# Altium footprint library SparkFun.PCBLIB: 674 footprints (part 8 of 44)
Each footprint in its own frame and in the unit in brackets; x right, y up, seen from the top. Pads: shape width x height; smd on the part's side, far side on the other; paste and mask are expansions set on the pad; w line width, h text height; cw(c..) or ccw(c..) is an arc to the next point about the centre after c.
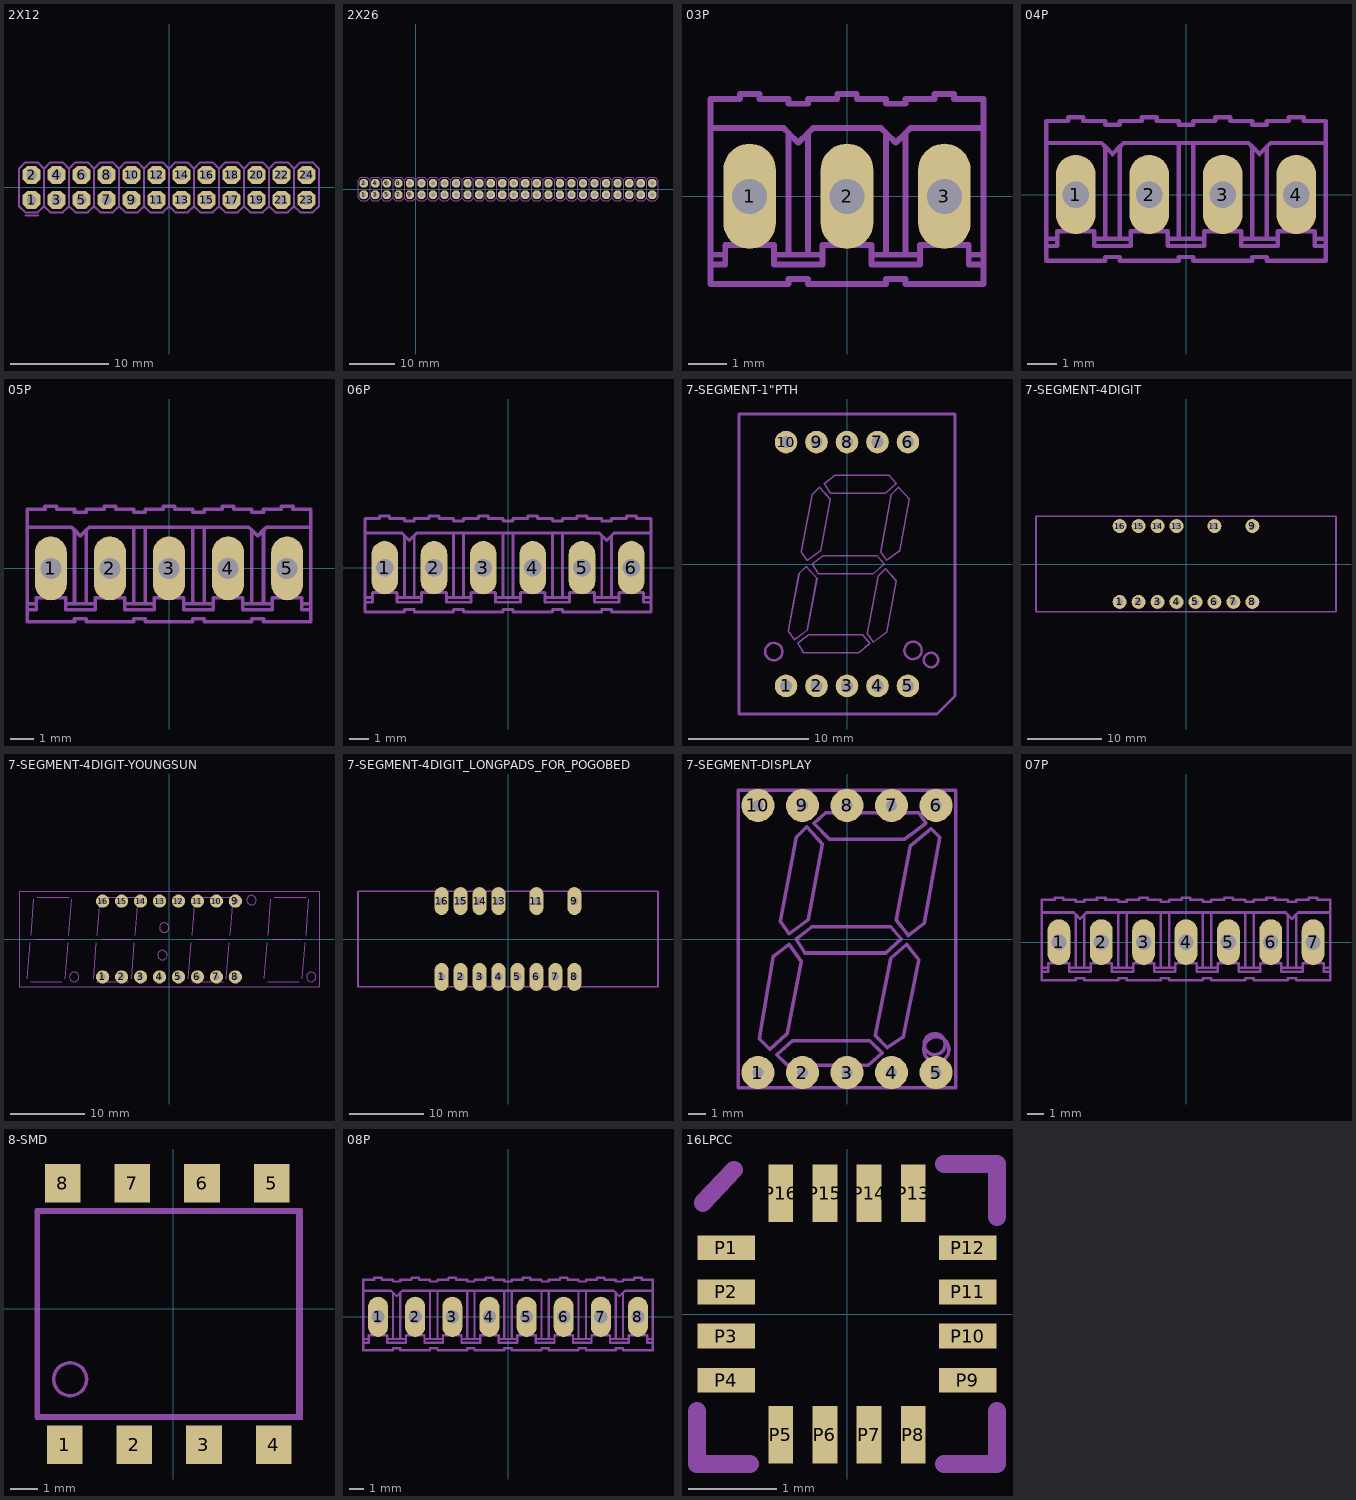
[diagram p7: the footprints below, top view; thin cyan lines are the x and y axes]

## 2X12 [mil]
pads (24):
  oct 71.65x71.65 hole 40: 1(-550,-50) 2(-550,50) 3(-450,-50) 4(-450,50) 5(-350,-50) 6(-350,50) 7(-250,-50) 8(-250,50) 9(-150,-50) 10(-150,50) 11(-50,-50) 12(-50,50) 13(50,-50) 14(50,50) 15(150,-50) 16(150,50) 17(250,-50) 18(250,50) 19(350,-50) 20(350,50) 21(450,-50) 22(450,50) 23(550,-50) 24(550,50)
Mechanical 2:
  lines w8: -575,-113.19 -525,-113.19 ; -500,-75 -525,-100 -575,-100 -600,-75 -600,75 -575,100 -525,100 -500,75 ; -500,-75 -475,-100 -425,-100 -400,-75 ; -500,-75 -500,75 ; -500,75 -475,100 -425,100 -400,75 ; -400,-75 -375,-100 -325,-100 -300,-75 ; -400,-75 -400,75 ; -400,75 -375,100 -325,100 -300,75 ; -300,-75 -300,75 ; -300,-75 -275,-100 -225,-100 -200,-75 ; -300,-75 -300,75 ; -300,75 -275,100 -225,100 -200,75 ; -200,-75 -175,-100 -125,-100 -100,-75 ; -200,-75 -200,75 ; -200,75 -175,100 -125,100 -100,75 ; -100,-75 -75,-100 -25,-100 0,-75 ; -100,-75 -100,75 ; -100,75 -75,100 -25,100 0,75 ; 0,-75 0,75 ; 0,-75 25,-100 75,-100 100,-75 ; 0,-75 0,75 ; 0,75 25,100 75,100 100,75 ; 100,-75 125,-100 175,-100 200,-75 ; 100,-75 100,75 ; 100,75 125,100 175,100 200,75 ; 200,-75 225,-100 275,-100 300,-75 ; 200,-75 200,75 ; 200,75 225,100 275,100 300,75 ; 300,-75 300,75 ; 300,-75 325,-100 375,-100 400,-75 ; 300,-75 300,75 ; 300,75 325,100 375,100 400,75 ; 400,-75 425,-100 475,-100 500,-75 ; 400,-75 400,75 ; 400,75 425,100 475,100 500,75 ; 500,-75 525,-100 575,-100 600,-75 600,75 575,100 525,100 500,75 ; 500,-75 500,75
Mechanical 18:
  rectangle: -560,-60 -540,-40
  rectangle: -560,40 -540,60
  rectangle: -460,40 -440,60
  rectangle: -460,-60 -440,-40
  rectangle: -360,40 -340,60
  rectangle: -360,-60 -340,-40
  rectangle: -260,-60 -240,-40
  rectangle: -260,40 -240,60
  rectangle: -160,40 -140,60
  rectangle: -160,-60 -140,-40
  rectangle: -60,40 -40,60
  rectangle: -60,-60 -40,-40
  rectangle: 40,-60 60,-40
  rectangle: 40,40 60,60
  rectangle: 140,40 160,60
  rectangle: 140,-60 160,-40
  rectangle: 240,40 260,60
  rectangle: 240,-60 260,-40
  rectangle: 340,-60 360,-40
  rectangle: 340,40 360,60
  rectangle: 440,40 460,60
  rectangle: 440,-60 460,-40
  rectangle: 540,40 560,60
  rectangle: 540,-60 560,-40

## 2X26 [mil]
pads (52):
  oct 71.65x71.65 hole 40: 1(-450,-50) 2(-450,50) 3(-350,-50) 4(-350,50) 5(-250,-50) 6(-250,50) 7(-150,-50) 8(-150,50) 9(-50,-50) 10(-50,50) 11(50,-50) 12(50,50) 13(150,-50) 14(150,50) 15(250,-50) 16(250,50) 17(350,-50) 18(350,50) 19(450,-50) 20(450,50) 21(550,-50) 22(550,50) 23(650,-50) 24(650,50) 25(750,-50) 26(750,50) 27(850,-50) 28(850,50) 29(950,-50) 30(950,50) 31(1050,-50) 32(1050,50) 33(1150,-50) 34(1150,50) 35(1250,-50) 36(1250,50) 37(1350,-50) 38(1350,50) 39(1450,-50) 40(1450,50) 41(1550,-50) 42(1550,50) 43(1650,-50) 44(1650,50) 45(1750,-50) 46(1750,50) 47(1850,-50) 48(1850,50) 49(1950,-50) 50(1950,50) 51(2050,-50) 52(2050,50)
Mechanical 2:
  drawing of 183 lines, arcs and shapes, not listed
Mechanical 18:
  rectangle: -460,-60 -440,-40
  rectangle: -460,40 -440,60
  rectangle: -360,40 -340,60
  rectangle: -360,-60 -340,-40
  rectangle: -260,40 -240,60
  rectangle: -260,-60 -240,-40
  rectangle: -160,40 -140,60
  rectangle: -60,40 -40,60
  rectangle: 40,40 60,60
  rectangle: -160,-60 -140,-40
  rectangle: -60,-60 -40,-40
  rectangle: 40,-60 60,-40
  rectangle: 140,40 160,60
  rectangle: 140,-60 160,-40
  rectangle: 240,40 260,60
  rectangle: 240,-60 260,-40
  rectangle: 340,40 360,60
  rectangle: 340,-60 360,-40
  rectangle: 440,40 460,60
  rectangle: 440,-60 460,-40
  rectangle: 540,-60 560,-40
  rectangle: 540,40 560,60
  rectangle: 640,40 660,60
  rectangle: 640,-60 660,-40
  rectangle: 740,40 760,60
  rectangle: 740,-60 760,-40
  rectangle: 840,40 860,60
  rectangle: 940,40 960,60
  rectangle: 1040,40 1060,60
  rectangle: 840,-60 860,-40
  rectangle: 940,-60 960,-40
  rectangle: 1040,-60 1060,-40
  rectangle: 1140,40 1160,60
  rectangle: 1140,-60 1160,-40
  rectangle: 1240,40 1260,60
  rectangle: 1240,-60 1260,-40
  rectangle: 1340,40 1360,60
  rectangle: 1340,-60 1360,-40
  rectangle: 1440,40 1460,60
  rectangle: 1440,-60 1460,-40
  rectangle: 1540,40 1560,60
  rectangle: 1640,40 1660,60
  rectangle: 1540,-60 1560,-40
  rectangle: 1640,-60 1660,-40
  rectangle: 1740,40 1760,60
  rectangle: 1740,-60 1760,-40
  rectangle: 1840,40 1860,60
  rectangle: 1840,-60 1860,-40
  rectangle: 1940,40 1960,60
  rectangle: 1940,-60 1960,-40
  rectangle: 2040,40 2060,60
  rectangle: 2040,-60 2060,-40

## 3.3V-DEVICE [mil]

## 03P [mil]
pads (3):
  oval 54x108 hole 36: 1(-100,0) 2(0,0) 3(100,0)
Mechanical 2:
  lines w6: -140,-70 -140,-90 -60,-90 -60,-85 -40,-85 -40,-90 40,-90 40,-85 60,-85 60,-90 140,-90 140,-70 ; -140,-70 -125,-70 -125,-60 ; -140,-70 -140,-60 ; -140,-60 -140,70 ; -140,-60 -125,-60 ; -140,70 -140,100 -110,100 -110,105 -90,105 -90,100 -60,100 -60,95 -40,95 -40,100 -10,100 -10,105 10,105 10,100 40,100 40,95 60,95 60,100 90,100 90,105 110,105 110,100 140,100 140,70 ; -140,70 -65,70 -60,65 ; -125,-60 -125,-50 -75,-50 -75,-60 ; -75,-60 -75,-70 -25,-70 -25,-60 ; -75,-60 -60,-60 ; -60,-60 -40,-60 ; -60,-60 -60,65 ; -60,65 -50,55 -40,65 ; -40,-60 -25,-60 ; -40,-60 -40,65 ; -40,65 -35,70 35,70 40,65 ; -25,-60 -25,-50 25,-50 25,-60 ; 25,-60 25,-70 75,-70 75,-60 ; 25,-60 40,-60 ; 40,-60 60,-60 ; 40,-60 40,65 ; 40,65 50,55 60,65 ; 60,-60 75,-60 ; 60,-60 60,65 ; 60,65 65,70 140,70 ; 75,-60 75,-50 125,-50 125,-60 ; 125,-60 125,-70 140,-70 ; 125,-60 140,-60 ; 140,-70 140,-60 ; 140,-60 140,70
Mechanical 18:
  rectangle: -113,-13 -87,13
  rectangle: -13,-13 13,13
  rectangle: 87,-13 113,13

## 04P [mil]
pads (4):
  oval 54x108 hole 36: 1(-150,0) 2(-50,0) 3(50,0) 4(150,0)
Mechanical 2:
  lines w6: 110,65 110,-60 ; -190,-70 -190,-90 -110,-90 -110,-85 -90,-85 -90,-90 -10,-90 -10,-85 10,-85 10,-90 90,-90 90,-85 110,-85 110,-90 190,-90 190,-70 ; -190,-70 -175,-70 -175,-60 ; -190,-70 -190,-60 ; -190,-60 -190,70 ; -190,-60 -175,-60 ; -190,70 -190,100 -160,100 -160,105 -140,105 -140,100 -110,100 -110,95 -90,95 -90,100 -60,100 -60,105 -40,105 -40,100 -10,100 -10,95 10,95 10,100 40,100 40,105 60,105 60,100 90,100 90,95 110,95 110,100 140,100 140,105 160,105 160,100 190,100 190,70 ; -190,70 -115,70 -110,65 ; -175,-60 -175,-50 -125,-50 -125,-60 ; -125,-60 -125,-70 -75,-70 -75,-60 ; -125,-60 -110,-60 ; -110,-60 -90,-60 ; -110,-60 -110,65 ; -110,65 -100,55 -90,65 ; -90,-60 -75,-60 ; -90,-60 -90,65 ; -90,65 -85,70 -10,70 ; -75,-60 -75,-50 -25,-50 -25,-60 ; -25,-60 -25,-70 25,-70 25,-60 ; -25,-60 -10,-60 ; -10,-60 10,-60 ; -10,-60 -10,70 ; -10,70 10,70 ; 10,-60 25,-60 ; 10,-60 10,70 ; 10,70 85,70 90,65 ; 25,-60 25,-50 75,-50 75,-60 ; 75,-60 75,-70 125,-70 125,-60 ; 75,-60 90,-60 ; 90,-60 110,-60 ; 90,-60 90,65 ; 90,65 100,55 115,70 190,70 ; 110,-60 125,-60 ; 125,-60 125,-50 175,-50 175,-60 ; 175,-60 175,-70 190,-70 ; 175,-60 190,-60 ; 190,-70 190,-60 ; 190,-60 190,70
Mechanical 18:
  rectangle: -163,-13 -137,13
  rectangle: -63,-13 -37,13
  rectangle: 37,-13 63,13
  rectangle: 137,-13 163,13

## 05P [mil]
pads (5):
  oval 54x108 hole 36: 1(-200,0) 2(-100,0) 3(0,0) 4(100,0) 5(200,0)
Mechanical 2:
  lines w6: -240,-70 -240,-90 -160,-90 -160,-85 -140,-85 -140,-90 -60,-90 -60,-85 -40,-85 -40,-90 40,-90 40,-85 60,-85 60,-90 140,-90 140,-85 160,-85 160,-90 240,-90 240,-70 ; -240,-70 -225,-70 -225,-60 ; -240,-70 -240,-60 ; -240,-60 -240,70 ; -240,-60 -225,-60 ; -240,70 -240,100 -210,100 -210,105 -190,105 -190,100 -160,100 -160,95 -140,95 -140,100 -110,100 -110,105 -90,105 -90,100 -60,100 -60,95 -40,95 -40,100 -10,100 -10,105 10,105 10,100 40,100 40,95 60,95 60,100 90,100 90,105 110,105 110,100 140,100 140,95 160,95 160,100 190,100 190,105 210,105 210,100 240,100 240,70 ; -240,70 -165,70 -160,65 ; -225,-60 -225,-50 -175,-50 -175,-60 ; -175,-60 -175,-70 -125,-70 -125,-60 ; -175,-60 -160,-60 ; -160,-60 -140,-60 ; -160,-60 -160,65 ; -160,65 -150,55 -140,65 ; -140,-60 -125,-60 ; -140,-60 -140,65 ; -140,65 -135,70 -60,70 ; -125,-60 -125,-50 -75,-50 -75,-60 ; -75,-60 -75,-70 -25,-70 -25,-60 ; -75,-60 -60,-60 ; -60,-60 -40,-60 ; -60,-60 -60,70 ; -60,70 -40,70 ; -40,-60 -25,-60 ; -40,-60 -40,70 ; -40,70 40,70 ; -25,-60 -25,-50 25,-50 25,-60 ; 25,-60 25,-70 75,-70 75,-60 ; 25,-60 40,-60 ; 40,-60 40,70 ; 40,-60 60,-60 ; 40,70 60,70 ; 60,-60 60,70 ; 60,-60 75,-60 ; 60,70 135,70 140,65 ; 75,-60 75,-50 125,-50 125,-60 ; 125,-60 125,-70 175,-70 175,-60 ; 125,-60 140,-60 ; 140,-60 160,-60 ; 140,-60 140,65 ; 140,65 150,55 160,65 ; 160,-60 175,-60 ; 160,-60 160,65 ; 160,65 165,70 240,70 ; 175,-60 175,-50 225,-50 225,-60 ; 225,-60 225,-70 240,-70 ; 225,-60 240,-60 ; 240,-70 240,-60 ; 240,-60 240,70
Mechanical 18:
  rectangle: -213,-13 -187,13
  rectangle: -113,-13 -87,13
  rectangle: -13,-13 13,13
  rectangle: 87,-13 113,13
  rectangle: 187,-13 213,13

## 06P [mil]
pads (6):
  oval 54x108 hole 36: 1(-250,0) 2(-150,0) 3(-50,0) 4(50,0) 5(150,0) 6(250,0)
Mechanical 2:
  drawing of 155 lines, arcs and shapes, not listed
Mechanical 18:
  rectangle: -263,-13 -237,13
  rectangle: -163,-13 -137,13
  rectangle: -63,-13 -37,13
  rectangle: 37,-13 63,13
  rectangle: 137,-13 163,13
  rectangle: 237,-13 263,13

## 7-SEGMENT-1"PTH [mil]
pads (10):
  round 74 hole 39.37: 1(-200,-400) 2(-100,-400) 3(0,-400) 4(100,-400) 5(200,-400) 6(200,400) 7(100,400) 8(0,400) 9(-100,400) 10(-200,400)
Mechanical 2:
  circle w8: c275.59,-314.96 r23.62
  lines w10: -354.33,-492.13 -354.33,492.13 354.33,492.13 354.33,-433.07 295.28,-492.13 -354.33,-492.13
Mechanical 18:
  circle w8: c216.54,-283.46 r28.39
  circle w8: c-240.16,-287.4 r28.39
  lines w5: -192.91,-220.47 -173.23,-248.03 -129.92,-216.54 -98.43,-47.24 -133.86,-7.87 -157.48,-31.5 -192.91,-220.47 ; -161.42,-259.84 -125.98,-232.28 51.18,-232.28 74.8,-259.84 39.37,-291.34 -141.73,-291.34 -161.42,-259.84 ; -149.61,39.37 -129.92,11.81 -86.61,43.31 -55.12,212.6 -90.55,251.97 -114.17,228.35 -149.61,39.37 ; -114.17,0 -78.74,27.56 98.43,27.56 122.05,0 86.61,-31.5 -94.49,-31.5 -114.17,0 ; -74.8,263.78 -39.37,291.34 137.8,291.34 161.42,263.78 125.98,232.28 -55.12,232.28 -74.8,263.78 ; 66.93,-228.35 86.61,-255.91 129.92,-224.41 161.42,-55.12 125.98,-15.75 102.36,-39.37 66.93,-228.35 ; 110.24,39.37 129.92,11.81 173.23,43.31 204.72,212.6 169.29,251.97 145.67,228.35 110.24,39.37

## 7-SEGMENT-4DIGIT [mil]
pads (14):
  round 74 hole 35.43: 1(-350,-200) 2(-250,-200) 3(-150,-200) 4(-50,-200) 5(50,-200) 6(150,-200) 7(250,-200) 8(350,-200) 9(350,200) 11(150,200) 13(-50,200) 14(-150,200) 15(-250,200) 16(-350,200)
Mechanical 2:
  lines w8: -791,-252 791,-252 791,252 -791,252 -791,-252

## 7-SEGMENT-4DIGIT-YOUNGSUN [mil]
pads (16):
  round 70 hole 31.5: 1(-350,-200) 2(-250,-200) 3(-150,-200) 4(-50,-200) 5(50,-200) 6(150,-200) 7(250,-200) 8(350,-200) 9(350,200) 10(250,200) 11(150,200) 12(50,200) 13(-50,200) 14(-150,200) 15(-250,200) 16(-350,200)
Mechanical 2:
  lines w5: -790.94,-251.97 -790.94,251.97 790.94,251.97 790.94,-251.97 -790.94,-251.97
Mechanical 18:
  circle w5: c-500,-200 r25
  circle w5: c-150,-200 r25
  circle w5: c350,-200 r25
  circle w5: c750,-200 r25
  circle w5: c-25,60 r25
  circle w5: c-35,-85 r25
  circle w5: c435,205 r25
  lines w5: -750,-210 -735,-20 ; -730,-225 -565,-225 ; -730,20 -715,210 ; -705,0 -550,0 ; -695,220 -525,220 ; -550,-210 -535,-20 ; -530,20 -515,210 ; -400,-210 -385,-20 ; -380,-225 -215,-225 ; -380,20 -365,210 ; -355,0 -200,0 ; -345,220 -175,220 ; -200,-210 -185,-20 ; -180,20 -165,210 ; 100,-210 115,-20 ; 120,-225 285,-225 ; 120,20 135,210 ; 145,0 300,0 ; 155,220 325,220 ; 300,-210 315,-20 ; 320,20 335,210 ; 500,-210 515,-20 ; 520,-225 685,-225 ; 520,20 535,210 ; 545,0 700,0 ; 555,220 725,220 ; 700,-210 715,-20 ; 720,20 735,210 ; -790.94,-251.97 790.94,-251.97 790.94,251.97 -790.94,251.97 -790.94,-251.97

## 7-SEGMENT-4DIGIT_LONGPADS_FOR_POGOBED [mil]
pads (14):
  oval 74x148 hole 40: 1(-350,-200) 2(-250,-200) 3(-150,-200) 4(-50,-200) 5(50,-200) 6(150,-200) 7(250,-200) 8(350,-200) 9(350,200) 11(150,200) 13(-50,200) 14(-150,200) 15(-250,200) 16(-350,200)
Mechanical 2:
  lines w8: -791,-252 791,-252 791,252 -791,252 -791,-252

## 7-SEGMENT-DISPLAY [mil]
pads (10):
  round 74 hole 25.59: 1(-200,-300) 2(-100,-300) 3(0,-300) 4(100,-300) 5(200,-300) 6(200,300) 7(100,300) 8(0,300) 9(-100,300) 10(-200,300)
Mechanical 2:
  circle w8: c196.85,-236.22 r23.62
  lines w8: -244.09,-334.65 -244.09,334.65 244.09,334.65 244.09,-334.65 -244.09,-334.65
Mechanical 18:
  circle w8: c200.79,-248.03 r28.39
  lines w8: -196.85,-224.41 -165.35,-39.37 -129.92,-11.81 -102.36,-51.18 -133.86,-212.6 -173.23,-248.03 -196.85,-224.41 ; -157.48,-259.84 -133.86,-283.46 47.24,-283.46 78.74,-255.91 51.18,-228.35 -122.05,-228.35 -157.48,-259.84 ; -149.61,39.37 -129.92,11.81 -86.61,43.31 -55.12,212.6 -90.55,251.97 -114.17,228.35 -149.61,39.37 ; -114.17,0 -94.49,-31.5 86.61,-31.5 122.05,0 98.43,27.56 -78.74,27.56 -114.17,0 ; -74.8,259.84 -47.24,283.46 161.42,283.46 177.17,259.84 129.92,224.41 -39.37,224.41 -74.8,259.84 ; 62.99,-216.54 90.55,-244.09 125.98,-220.47 161.42,-47.24 133.86,-11.81 98.43,-43.31 62.99,-216.54 ; 110.24,43.31 137.8,7.87 173.23,35.43 208.66,228.35 188.98,248.03 141.73,208.66 110.24,43.31

## 07P [mil]
pads (7):
  oval 54x108 hole 36: 1(-300,0) 2(-200,0) 3(-100,0) 4(0,0) 5(100,0) 6(200,0) 7(300,0)
Mechanical 2:
  drawing of 180 lines, arcs and shapes, not listed
Mechanical 18:
  rectangle: -313,-13 -287,13
  rectangle: -213,-13 -187,13
  rectangle: -113,-13 -87,13
  rectangle: -13,-13 13,13
  rectangle: 87,-13 113,13
  rectangle: 287,-13 313,13
  rectangle: 187,-13 213,13

## 8-SMD [mil]
pads (8):
  rect 51.18x55.12 smd: 1(-155.91,-195.28) 2(-55.91,-195.28) 3(44.09,-195.28) 4(144.09,-195.28) 5(141.34,180.32) 6(41.34,180.32) 7(-58.66,180.32) 8(-158.66,180.32)
Mechanical 2:
  circle w5: c-148.03,-101.18 r23.59
  lines w8: -195,-155 180,-155 180,140 -195,140 -195,-155
Mechanical 18:
  lines w3.94: 184.25,-156.69 184.25,142.52 -196.85,142.52 -196.85,-157.48 184.65,-157.48

## 08P [mil]
pads (8):
  oval 54x108 hole 36: 1(-350,0) 2(-250,0) 3(-150,0) 4(-50,0) 5(50,0) 6(150,0) 7(250,0) 8(350,0)
Mechanical 2:
  drawing of 205 lines, arcs and shapes, not listed
Mechanical 18:
  rectangle: -363,-13 -337,13
  rectangle: -263,-13 -237,13
  rectangle: -163,-13 -137,13
  rectangle: -63,-13 -37,13
  rectangle: 37,-13 63,13
  rectangle: 237,-13 263,13
  rectangle: 137,-13 163,13
  rectangle: 337,-13 363,13

## 16LPCC [mm]
pads (16):
  rect 0.65x0.28 smd: P1(-1.37,0.75) P2(-1.37,0.25) P3(-1.37,-0.25) P4(-1.37,-0.75) P9(1.37,-0.75) P10(1.37,-0.25) P11(1.37,0.25) P12(1.37,0.75)
  rect 0.28x0.65 smd: P5(-0.75,-1.37) P6(-0.25,-1.37) P7(0.25,-1.37) P8(0.75,-1.37) P13(0.75,1.37) P14(0.25,1.37) P15(-0.25,1.37) P16(-0.75,1.37)
Mechanical 2:
  lines w0.203: -1.7,-1.1 -1.7,-1.7 -1.1,-1.7 ; -1.635,1.26 -1.28,1.635 ; 1.1,-1.7 1.7,-1.7 1.7,-1.1 ; 1.1,1.7 1.7,1.7 1.7,1.1